# Altium footprint library Troposphere_lib.PcbLib: 48 footprints (part 1 of 3)
Each footprint in its own frame and in the unit in brackets; x right, y up, seen from the top. Pads: shape width x height; smd on the part's side, far side on the other; paste and mask are expansions set on the pad; w line width, h text height; cw(c..) or ccw(c..) is an arc to the next point about the centre after c.
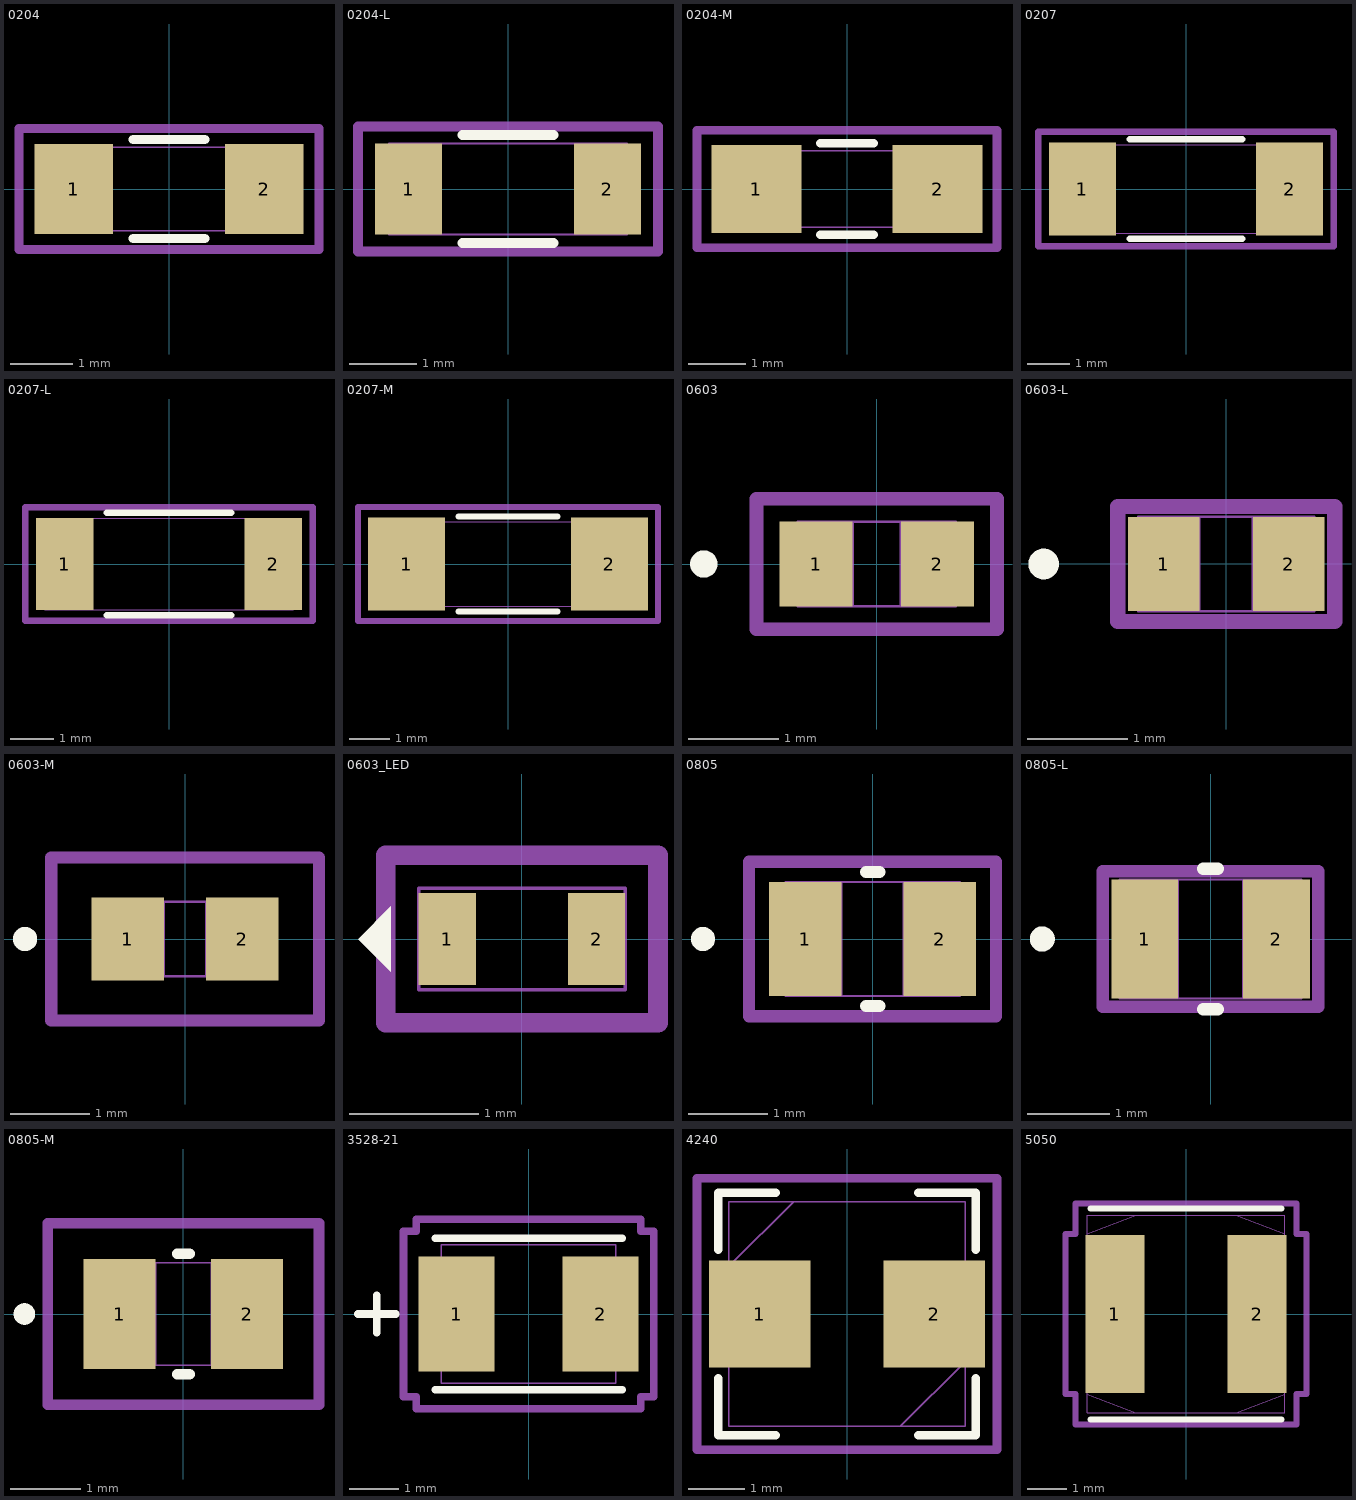
[diagram p0: the footprints below, top view; thin cyan lines are the x and y axes]

## 0204 [mil]
pads (2):
  rect 50x57 smd paste+0 mask+0: 1(-60.5,0) 2(60.5,0)
Top Overlay:
  lines w6: -22.75,-31.5 22.75,-31.5 ; -22.75,31.5 22.75,31.5
Mechanical 13:
  lines w1: -69.5,-13.25 -56.25,-26.5 ; -69.5,13.25 -56.25,26.5 ; -69.5,-26.5 -69.5,26.5 69.5,26.5 69.5,-26.5 -69.5,-26.5
Mechanical 15:
  lines w6: -95.5,-38.5 95.5,-38.5 95.5,38.5 -95.5,38.5 -95.5,-38.5
3D body "MMA0204.stp": height 52.99, standoff 0, extent -69.48,-26.49 69.49,26.5

## 0204-L [mil]
pads (2):
  rect 39x53 smd paste+0 mask+0: 1(-58,0) 2(58,0)
Top Overlay:
  lines w6: -26.39,-31.5 26.39,-31.5 ; -26.39,31.5 26.39,31.5
Mechanical 13:
  lines w1: -69.5,-13.25 -56.25,-26.5 ; -69.5,13.25 -56.25,26.5 ; -69.5,-26.5 69.5,-26.5 69.5,26.5 -69.5,26.5 -69.5,-26.5
Mechanical 15:
  lines w6: -87.5,-36.5 -87.5,36.5 87.5,36.5 87.5,-36.5 -87.5,-36.5
3D body "MMA0204-L.stp": height 52.99, standoff 0, extent -69.48,-26.49 69.49,26.5

## 0204-M [mil]
pads (2):
  rect 62x61 smd paste+0 mask+0: 1(-62.5,0) 2(62.5,0)
Top Overlay:
  lines w6: -18.44,-31.5 18.44,-31.5 ; -18.44,31.5 18.44,31.5
Mechanical 13:
  lines w1: -69.5,-13.25 -56.25,-26.5 ; -69.5,13.25 -56.25,26.5 ; -69.5,-26.5 -69.5,26.5 69.5,26.5 69.5,-26.5 -69.5,-26.5
Mechanical 15:
  lines w6: -103.5,-40.5 103.5,-40.5 103.5,40.5 -103.5,40.5 -103.5,-40.5
3D body "MMA0204-M.stp": height 52.99, standoff 0, extent -69.48,-26.49 69.5,26.5

## 0207 [mil]
pads (2):
  rect 63x87 smd paste+0 mask+0: 1(-97,0) 2(97,0)
Top Overlay:
  lines w6: -52.75,-46.5 52.75,-46.5 ; -52.75,46.5 52.75,46.5
Mechanical 13:
  lines w1: -112.5,-20.75 -91.75,-41.5 ; -112.5,20.75 -91.75,41.5 ; -112.5,-41.5 112.5,-41.5 112.5,41.5 -112.5,41.5 -112.5,-41.5
Mechanical 15:
  lines w6: -138.5,-53.5 -138.5,53.5 138.5,53.5 138.5,-53.5 -138.5,-53.5
3D body "MMB0207.stp": height 82.99, standoff 0, extent -112.51,-41.49 112.52,41.5

## 0207-L [mil]
pads (2):
  rect 52x83 smd paste+0 mask+0: 1(-94.5,0) 2(94.5,0)
Top Overlay:
  lines w6: -56.39,-46.5 56.39,-46.5 ; -56.39,46.5 56.39,46.5
Mechanical 13:
  lines w1: -112.5,-20.75 -91.75,-41.5 ; -112.5,20.75 -91.75,41.5 ; -112.5,-41.5 -112.5,41.5 112.5,41.5 112.5,-41.5 -112.5,-41.5
Mechanical 15:
  lines w6: -130.5,-51.5 130.5,-51.5 130.5,51.5 -130.5,51.5 -130.5,-51.5
3D body "MMB0207-L.stp": height 82.99, standoff 0, extent -112.51,-41.49 112.52,41.5

## 0207-M [mil]
pads (2):
  rect 75x91 smd paste+0 mask+0: 1(-99,0) 2(99,0)
Top Overlay:
  lines w6: -48.44,-46.5 48.44,-46.5 ; -48.44,46.5 48.44,46.5
Mechanical 13:
  lines w1: -112.5,-20.75 -91.75,-41.5 ; -112.5,20.75 -91.75,41.5 ; -112.5,-41.5 -112.5,41.5 112.5,41.5 112.5,-41.5 -112.5,-41.5
Mechanical 15:
  lines w6: -146.5,-55.5 146.5,-55.5 146.5,55.5 -146.5,55.5 -146.5,-55.5
3D body "MMB0207-M.stp": height 82.99, standoff 0, extent -112.51,-41.49 112.52,41.5

## 0603 [mil]
pads (2):
  rect 32x37 smd paste+0 mask+0: 1(-26.5,0) 2(26.5,0)
Top Overlay:
  circle w6: c-75.5,0 r3
Mechanical 13:
  circle w0: c-21.5,0 r3
  lines w1: -34.5,-18.5 -34.5,18.5 ; -34.5,-18.5 34.5,-18.5 ; -34.5,-18.5 -10.5,-18.5 -10.5,18.5 -34.5,18.5 ; -34.5,-18.5 -34.5,18.5 ; -34.5,18.5 34.5,18.5 ; 34.5,-18.5 34.5,18.5 ; 34.5,-18.5 34.5,18.5 ; 34.5,-18.5 10.5,-18.5 10.5,18.5 34.5,18.5
Mechanical 15:
  lines w6: -52.5,-28.5 52.5,-28.5 52.5,28.5 -52.5,28.5 -52.5,-28.5
3D body "IND_BLM18_0603.stp": height 37.01, standoff 0, extent -34.48,-18.5 34.5,18.51

## 0603-L [mil]
pads (2):
  rect 28x37 smd paste+0 mask+0: 1(-24.5,0) 2(24.5,0)
Top Overlay:
  circle w6: c-71.5,0 r3
Mechanical 13:
  circle w0: c-19.5,0 r3
  lines w1: -34.5,-18.5 -34.5,18.5 ; -34.5,-18.5 34.5,-18.5 ; -34.5,-18.5 -10.5,-18.5 -10.5,18.5 -34.5,18.5 ; -34.5,-18.5 -34.5,18.5 ; -34.5,18.5 34.5,18.5 ; 34.5,-18.5 34.5,18.5 ; 34.5,-18.5 34.5,18.5 ; 34.5,-18.5 10.5,-18.5 10.5,18.5 34.5,18.5
Mechanical 15:
  lines w6: -42.5,-22.5 42.5,-22.5 42.5,22.5 -42.5,22.5 -42.5,-22.5
3D body "IND_BLM18_0603-L.stp": height 37.01, standoff 0, extent -34.48,-18.5 34.5,18.51

## 0603-M [mil]
pads (2):
  rect 36x41 smd paste+0 mask+0: 1(-28.5,0) 2(28.5,0)
Top Overlay:
  circle w6: c-79.5,0 r3
Mechanical 13:
  circle w0: c-23.5,0 r3
  lines w1: -34.5,-18.5 -34.5,18.5 ; -34.5,-18.5 -10.5,-18.5 -10.5,18.5 -34.5,18.5 ; -34.5,-18.5 34.5,-18.5 ; -34.5,-18.5 -34.5,18.5 ; -34.5,18.5 34.5,18.5 ; 34.5,-18.5 10.5,-18.5 10.5,18.5 34.5,18.5 ; 34.5,-18.5 34.5,18.5 ; 34.5,-18.5 34.5,18.5
Mechanical 15:
  lines w6: -66.5,-40.5 -66.5,40.5 66.5,40.5 66.5,-40.5 -66.5,-40.5
3D body "IND_BLM18_0603-M.stp": height 37.01, standoff 0, extent -34.48,-18.49 34.5,18.51

## 0603_LED [mil]
pads (2):
  rect 17.5x28 smd paste+0 mask+0: 1(-22.75,0) 2(22.75,0)
Top Overlay:
  region: -40,10 -40,-10 -50,0
Mechanical 13:
  lines w1: -31.5,-15.5 31.5,-15.5 31.5,15.5 -31.5,15.5 -31.5,-15.5
Mechanical 15:
  lines w6: -41.5,-25.5 -41.5,-24 -41.5,24 -41.5,25.5 41.5,25.5 41.5,24 41.5,-24 41.5,-25.5 -41.5,-25.5
3D body "LITE-ON - LTST-C190TBKT.step": height 31.54, standoff 0, extent -31.49,-15.74 31.5,15.75

## 0805 [mil]
pads (2):
  rect 36x57 smd paste+0 mask+0: 1(-33.5,0) 2(33.5,0)
Top Overlay:
  circle w6: c-84.5,0 r3
  lines w6: -3.39,-33.5 3.39,-33.5 ; -3.39,33.5 3.39,33.5
Mechanical 13:
  circle w0: c-28.5,0 r3
  lines w1: -43.5,-28.5 -43.5,28.5 ; -43.5,-28.5 43.5,-28.5 ; -43.5,-28.5 -15.5,-28.5 -15.5,28.5 -43.5,28.5 ; -43.5,-28.5 -43.5,28.5 ; -43.5,28.5 43.5,28.5 ; 43.5,-28.5 43.5,28.5 ; 43.5,-28.5 43.5,28.5 ; 43.5,-28.5 15.5,-28.5 15.5,28.5 43.5,28.5
Mechanical 15:
  lines w6: -61.5,-38.5 61.5,-38.5 61.5,38.5 -61.5,38.5 -61.5,-38.5
3D body "IND_BLM21_0805.stp": height 40.98, standoff 0, extent -43.5,-28.5 43.51,28.51

## 0805-L [mil]
pads (2):
  rect 32x57 smd paste+0 mask+0: 1(-31.5,0) 2(31.5,0)
Top Overlay:
  circle w6: c-80.5,0 r3
  lines w6: -3.39,-33.5 3.39,-33.5 ; -3.39,33.5 3.39,33.5
Mechanical 13:
  circle w0: c-26.5,0 r3
  lines w1: -43.5,-28.5 -43.5,28.5 ; -43.5,-28.5 43.5,-28.5 ; -43.5,-28.5 -15.5,-28.5 -15.5,28.5 -43.5,28.5 ; -43.5,-28.5 -43.5,28.5 ; -43.5,28.5 43.5,28.5 ; 43.5,-28.5 43.5,28.5 ; 43.5,-28.5 43.5,28.5 ; 43.5,-28.5 15.5,-28.5 15.5,28.5 43.5,28.5
Mechanical 15:
  lines w6: -51.5,-32.5 51.5,-32.5 51.5,32.5 -51.5,32.5 -51.5,-32.5
3D body "IND_BLM21_0805-L.stp": height 40.98, standoff 0, extent -43.5,-28.5 43.51,28.51

## 0805-M [mil]
pads (2):
  rect 40x61 smd paste+0 mask+0: 1(-35.5,0) 2(35.5,0)
Top Overlay:
  circle w6: c-88.5,0 r3
  lines w6: -3.39,-33.5 3.39,-33.5 ; -3.39,33.5 3.39,33.5
Mechanical 13:
  circle w0: c-30.5,0 r3
  lines w1: -43.5,-28.5 -43.5,28.5 ; -43.5,-28.5 43.5,-28.5 ; -43.5,-28.5 -15.5,-28.5 -15.5,28.5 -43.5,28.5 ; -43.5,-28.5 -43.5,28.5 ; -43.5,28.5 43.5,28.5 ; 43.5,-28.5 43.5,28.5 ; 43.5,-28.5 43.5,28.5 ; 43.5,-28.5 15.5,-28.5 15.5,28.5 43.5,28.5
Mechanical 15:
  lines w6: -75.5,-50.5 75.5,-50.5 75.5,50.5 -75.5,50.5 -75.5,-50.5
3D body "IND_BLM21_0805-M.stp": height 40.98, standoff 0, extent -43.5,-28.49 43.51,28.51

## 3528-21 [mil]
pads (2):
  rect 60x91 smd paste+0 mask+0: 1(-57,0) 2(57,0)
Top Overlay:
  lines w6: -135,0 -105,0 ; -120,-15 -120,15 ; -74,-60 74,-60 ; -74,60 74,60
Mechanical 13:
  lines w1: -135,0 -105,0 ; -120,-15 -120,15 ; -69,-55 -69,55 69,55 69,-55 -69,-55
Mechanical 15:
  lines w6: -99,-65.5 -89,-65.5 -89,-75 89,-75 89,-65.5 99,-65.5 99,65.5 89,65.5 89,75 -89,75 -89,65.5 -99,65.5 -99,-65.5
3D body "PCAP3528-21_Kemet.stp": height 85, standoff 0, extent -69.01,-54.99 69.02,55

## 4240 [mm]
pads (2):
  rect 1.8x1.9 smd mask+0: 1(-1.55,0) 2(1.55,0)
Top Overlay:
  lines w0.152: -2.286,-1.143 -2.286,-2.159 -1.27,-2.159 ; -2.286,1.143 -2.286,2.159 -1.27,2.159 ; 1.27,-2.159 2.286,-2.159 2.286,-1.143 ; 1.27,2.159 2.286,2.159 2.286,1.143
Mechanical 13:
  lines w0.025: -2.1,0.85 -0.95,2 ; 0.95,-2 2.1,-0.85 ; -2.1,-2 -2.1,2 2.1,2 2.1,-2 -2.1,-2
Mechanical 15:
  lines w0.152: -2.667,-2.413 -2.667,2.413 2.667,2.413 2.667,-2.413 -2.667,-2.413
3D body: height 3, standoff 0, extent -2.1,-2 2.1,2

## 5050 [mm]
pads (2):
  rect 1.5x4 smd mask+0: 1(-1.8,0) 2(1.8,0)
Top Overlay:
  lines w0.152: -2.413,-2.667 2.413,-2.667 ; -2.413,2.667 2.413,2.667
Mechanical 13:
  lines w0.025: -2.5,-2.032 -1.27,-2.5 ; -2.5,2.032 -1.27,2.5 ; 1.27,-2.5 2.5,-2.032 ; 1.27,2.5 2.5,2.032 ; -2.5,-2.5 2.5,-2.5 2.5,2.5 -2.5,2.5 -2.5,-2.5
Mechanical 15:
  lines w0.152: -3.048,-2.032 -3.048,2.032 -2.794,2.032 -2.794,2.794 2.794,2.794 2.794,2.032 3.048,2.032 3.048,-2.032 2.794,-2.032 2.794,-2.794 -2.794,-2.794 -2.794,-2.032 -3.048,-2.032
3D body "vls5045ex-ca.step": height 4.49, standoff -0.01, extent -2.5,-2.5 2.5,2.5